# Altium footprint library ICs And Semiconductors THD.PcbLib: 507 footprints (part 30 of 32)
Each footprint in its own frame and in the unit in brackets; x right, y up, seen from the top. Pads: shape width x height; smd on the part's side, far side on the other; paste and mask are expansions set on the pad; w line width, h text height; cw(c..) or ccw(c..) is an arc to the next point about the centre after c.
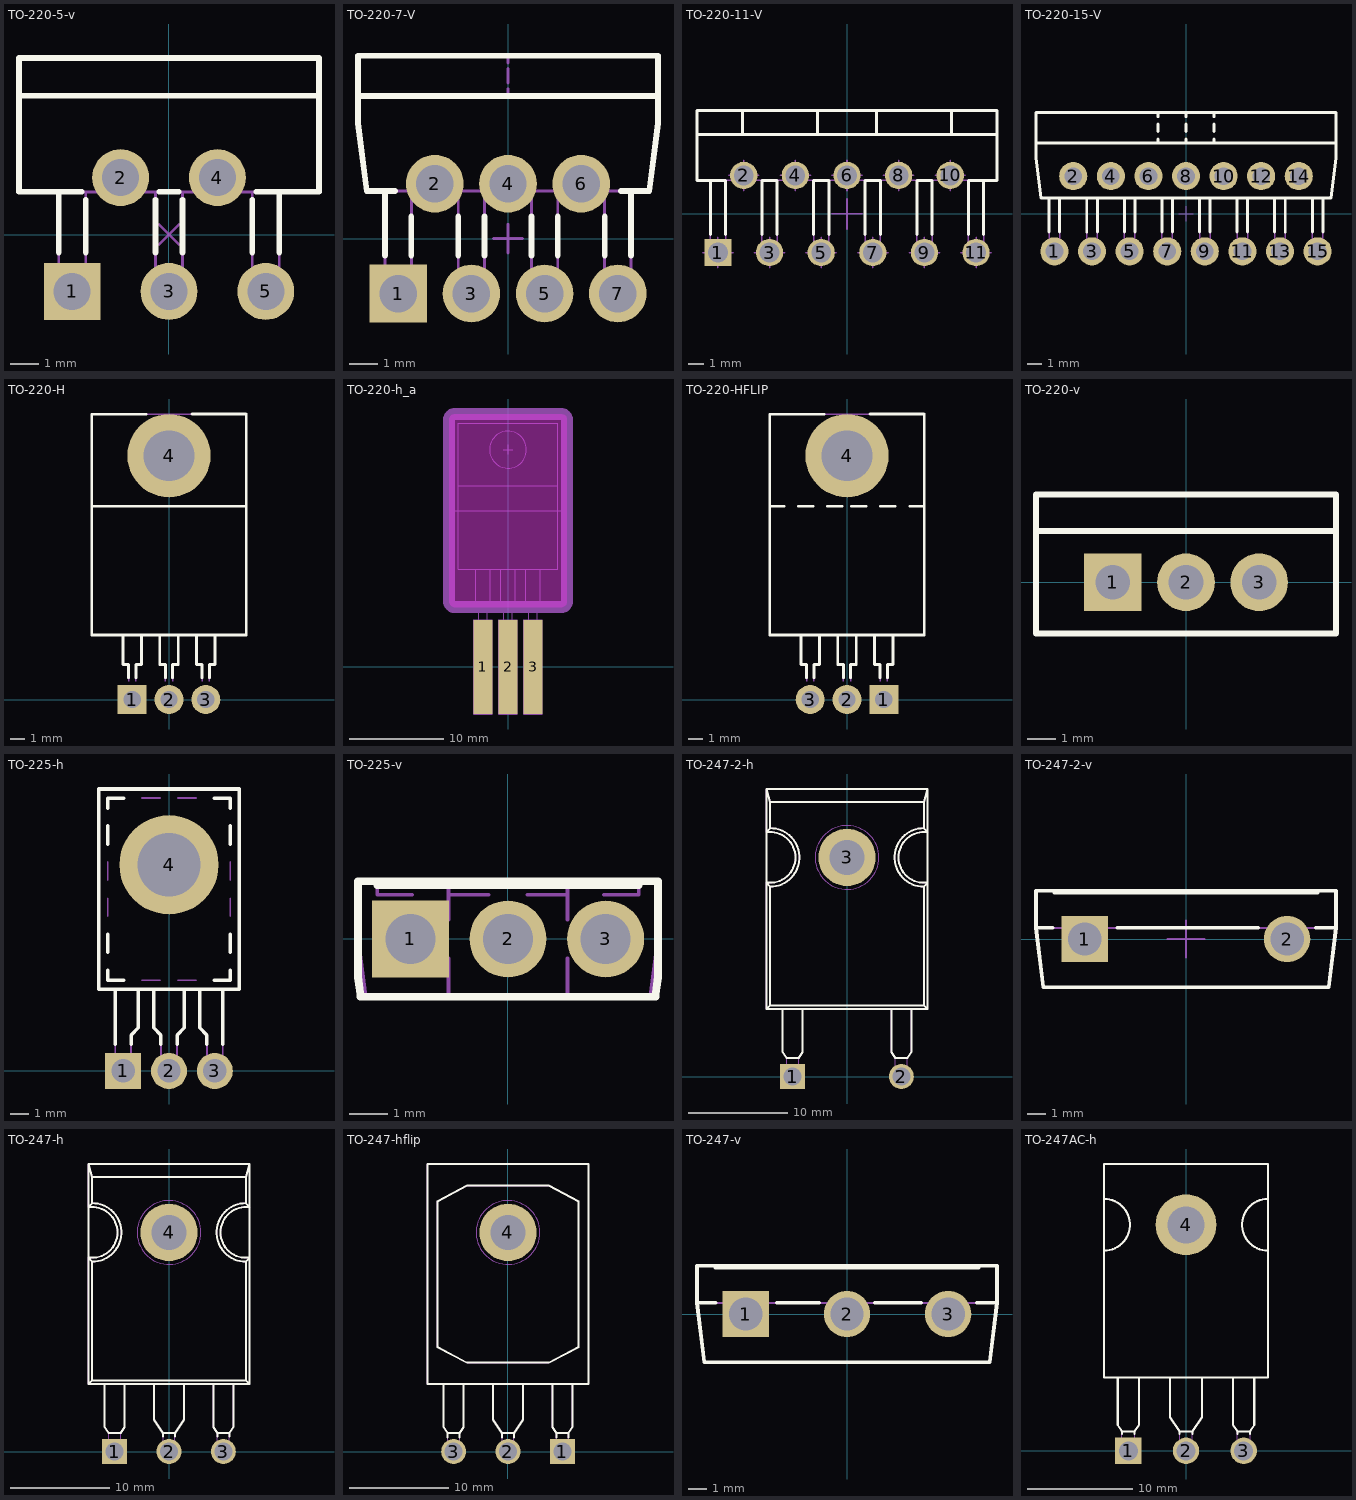
[diagram p29: the footprints below, top view; thin cyan lines are the x and y axes]

## TO-220-5-v [mm] "TO-220 5-Terminal - Vertical Mount"
height 15.57
pads (5):
  rect 2x2 hole 1.3: 1(-3.4,-2)
  round 2 hole 1.3: 2(-1.7,2) 3(0,-2) 4(1.7,2) 5(3.4,-2)
Top Overlay:
  lines w0.2: -5.27,4.88 5.27,4.88 ; -3.875,-0.63 -3.875,1.5 ; -3.061,1.5 -5.27,1.5 -5.27,6.2 5.27,6.2 5.27,1.5 3.061,1.5 ; -2.925,-0.63 -2.925,1.224 ; -0.475,-0.63 -0.475,1.224 ; -0.339,1.5 0.339,1.5 ; 0.475,-0.63 0.475,1.224 ; 2.925,-0.63 2.925,1.224 ; 3.875,-0.63 3.875,1.5
Notvisible:
  lines w0.1: -3.9,-2 -3.4,-2 ; -3.4,-2.5 -3.4,-2 ; -3.4,-1.5 -3.4,-2 ; -2.9,-2 -3.4,-2 ; -2.2,2 -1.7,2 ; -1.7,1.5 -1.7,2 ; -1.7,2.5 -1.7,2 ; -1.2,2 -1.7,2 ; -0.5,-2 0,-2 ; -0.353,-0.354 0,0 ; -0.353,0.354 0,0 ; 0,-2.5 0,-2 ; 0,-1.5 0,-2 ; 0.354,-0.354 0,0 ; 0.354,0.354 0,0 ; 0.5,-2 0,-2 ; 1.2,2 1.7,2 ; 1.7,1.5 1.7,2 ; 1.7,2.5 1.7,2 ; 2.2,2 1.7,2 ; 2.9,-2 3.4,-2 ; 3.4,-2.5 3.4,-2 ; 3.4,-1.5 3.4,-2 ; 3.9,-2 3.4,-2
Mechanical 14:
  lines w0.1: -5.27,4.88 5.27,4.88 ; -3.875,1.5 -3.875,-2.32 -2.925,-2.32 -2.925,1.5 ; -0.475,1.5 -0.475,-2.32 0.475,-2.32 0.475,1.5 ; 2.925,1.5 2.925,-2.32 3.875,-2.32 3.875,1.5 ; -5.27,1.5 5.27,1.5 5.27,6.2 -5.27,6.2 -5.27,1.5
3D body "TO-220-5-V.stp": height 21.79, standoff -3.8, extent -5.27,-2.32 5.27,6.2

## TO-220-7-V [mm] "TO-220 7 Leads - Vertical Mount"
height 21.37
pads (7):
  rect 2x2 hole 1.3: 1(-3.81,-1.905)
  round 2 hole 1.3: 2(-2.54,1.905) 3(-1.27,-1.905) 4(0,1.905) 5(1.27,-1.905) 6(2.54,1.905) 7(3.81,-1.905)
Top Overlay:
  lines w0.2: -5.205,4.95 5.205,4.95 ; -4.265,-0.581 -4.265,1.65 ; -3.917,1.65 -4.905,1.65 -5.205,4 -5.205,6.35 5.205,6.35 5.205,4 4.905,1.65 3.917,1.65 ; -3.355,-0.581 -3.355,0.767 ; -1.725,-0.581 -1.725,0.767 ; -0.815,-0.581 -0.815,0.767 ; 0.815,-0.581 0.815,0.767 ; 1.725,-0.581 1.725,0.767 ; 3.355,-0.581 3.355,0.767 ; 4.265,-0.581 4.265,1.65
Notvisible:
  lines w0.1: -4.31,-1.905 -3.81,-1.905 ; -3.81,-2.405 -3.81,-1.905 ; -3.81,-1.405 -3.81,-1.905 ; -3.31,-1.905 -3.81,-1.905 ; -3.04,1.905 -2.54,1.905 ; -2.54,1.405 -2.54,1.905 ; -2.54,2.405 -2.54,1.905 ; -2.04,1.905 -2.54,1.905 ; -1.77,-1.905 -1.27,-1.905 ; -1.27,-2.405 -1.27,-1.905 ; -1.27,-1.405 -1.27,-1.905 ; -0.77,-1.905 -1.27,-1.905 ; -0.5,0 0,0 ; -0.5,1.905 0,1.905 ; 0,-0.5 0,0 ; 0,0.5 0,0 ; 0,1.405 0,1.905 ; 0,2.405 0,1.905 ; 0,4.95 0,5.2 ; 0,5.4 0,5.65 0,5.9 ; 0,6.1 0,6.35 ; 0.5,0 0,0 ; 0.5,1.905 0,1.905 ; 0.77,-1.905 1.27,-1.905 ; 1.27,-2.405 1.27,-1.905 ; 1.27,-1.405 1.27,-1.905 ; 1.77,-1.905 1.27,-1.905 ; 2.04,1.905 2.54,1.905 ; 2.54,1.405 2.54,1.905 ; 2.54,2.405 2.54,1.905 ; 3.04,1.905 2.54,1.905 ; 3.31,-1.905 3.81,-1.905 ; 3.81,-2.405 3.81,-1.905 ; 3.81,-1.405 3.81,-1.905 ; 4.31,-1.905 3.81,-1.905
Mechanical 14:
  lines w0.1: -5.205,4.95 5.205,4.95 ; -4.265,1.65 -4.265,-2.23 -3.355,-2.23 -3.355,1.65 ; -2.995,1.65 -2.995,1.58 -2.085,1.58 -2.085,1.65 ; -1.725,1.65 -1.725,-2.23 -0.815,-2.23 -0.815,1.65 ; -0.455,1.65 -0.455,1.58 0.455,1.58 0.455,1.65 ; 0.815,1.65 0.815,-2.23 1.725,-2.23 1.725,1.65 ; 2.085,1.65 2.085,1.58 2.995,1.58 2.995,1.65 ; 3.355,1.65 3.355,-2.23 4.265,-2.23 4.265,1.65 ; -5.205,4 -5.205,6.35 5.205,6.35 5.205,4 4.905,1.65 -4.905,1.65 -5.205,4
3D body "TO-220-7-V.stp": height 21.74, standoff -3.8, extent -5.205,-2.23 5.205,6.35

## TO-220-11-V [mm] "TO-220 11 Leads - Vertical Mount"
height 20.82
pads (11):
  rect 1.8x1.8 hole 1.3: 1(-8.5,-2.54)
  round 1.8 hole 1.3: 2(-6.8,2.54) 3(-5.1,-2.54) 4(-3.4,2.54) 5(-1.7,-2.54) 6(0,2.54) 7(1.7,-2.54) 8(3.4,2.54) 9(5.1,-2.54) 10(6.8,2.54) 11(8.5,-2.54)
Top Overlay:
  lines w0.2: -9.88,5.23 9.88,5.23 ; -9,-1.34 -9,2.21 ; -8,-1.34 -8,2.21 -9.88,2.21 -9.88,6.83 9.88,6.83 9.88,2.21 8,2.21 8,-1.34 ; -6.88,5.23 -6.88,6.83 ; -5.6,-1.34 -5.6,2.21 -4.6,2.21 -4.6,-1.34 ; -2.2,-1.34 -2.2,2.21 -1.2,2.21 -1.2,-1.34 ; -1.93,5.23 -1.93,6.83 ; 1.2,-1.34 1.2,2.21 2.2,2.21 2.2,-1.34 ; 1.93,5.23 1.93,6.83 ; 4.6,-1.34 4.6,2.21 5.6,2.21 5.6,-1.34 ; 6.88,5.23 6.88,6.83 ; 9,-1.34 9,2.21
Notvisible:
  lines w0.1: -9.5,-2.54 -8.5,-2.54 ; -8.5,-3.54 -8.5,-2.54 ; -8.5,-1.54 -8.5,-2.54 ; -7.8,2.54 -6.8,2.54 ; -7.5,-2.54 -8.5,-2.54 ; -6.8,1.54 -6.8,2.54 ; -6.8,3.54 -6.8,2.54 ; -6.1,-2.54 -5.1,-2.54 ; -5.8,2.54 -6.8,2.54 ; -5.1,-3.54 -5.1,-2.54 ; -5.1,-1.54 -5.1,-2.54 ; -4.4,2.54 -3.4,2.54 ; -4.1,-2.54 -5.1,-2.54 ; -3.4,1.54 -3.4,2.54 ; -3.4,3.54 -3.4,2.54 ; -2.7,-2.54 -1.7,-2.54 ; -2.4,2.54 -3.4,2.54 ; -1.7,-3.54 -1.7,-2.54 ; -1.7,-1.54 -1.7,-2.54 ; -1,0 0,0 ; -1,2.54 0,2.54 ; -0.7,-2.54 -1.7,-2.54 ; 0,-1 0,0 ; 0,1 0,0 ; 0,1.54 0,2.54 ; 0,3.54 0,2.54 ; 0.7,-2.54 1.7,-2.54 ; 1,0 0,0 ; 1,2.54 0,2.54 ; 1.7,-3.54 1.7,-2.54 ; 1.7,-1.54 1.7,-2.54 ; 2.4,2.54 3.4,2.54 ; 2.7,-2.54 1.7,-2.54 ; 3.4,1.54 3.4,2.54 ; 3.4,3.54 3.4,2.54 ; 4.1,-2.54 5.1,-2.54 ; 4.4,2.54 3.4,2.54 ; 5.1,-3.54 5.1,-2.54 ; 5.1,-1.54 5.1,-2.54 ; 5.8,2.54 6.8,2.54 ; 6.1,-2.54 5.1,-2.54 ; 6.8,1.54 6.8,2.54 ; 6.8,3.54 6.8,2.54 ; 7.5,-2.54 8.5,-2.54 ; 7.8,2.54 6.8,2.54 ; 8.5,-3.54 8.5,-2.54 ; 8.5,-1.54 8.5,-2.54 ; 9.5,-2.54 8.5,-2.54
Mechanical 14:
  lines w0.1: -9.88,5.23 9.88,5.23 ; -9,2.21 -9,-2.84 -8,-2.84 -8,2.21 ; -6.88,5.23 -6.88,6.83 ; -5.6,2.21 -5.6,-2.84 -4.6,-2.84 -4.6,2.21 ; -2.2,2.21 -2.2,-2.84 -1.2,-2.84 -1.2,2.21 ; -1.93,5.23 -1.93,6.83 ; 1.2,2.21 1.2,-2.84 2.2,-2.84 2.2,2.21 ; 1.93,5.23 1.93,6.83 ; 4.6,2.21 4.6,-2.84 5.6,-2.84 5.6,2.21 ; 6.88,5.23 6.88,6.83 ; 8,2.21 8,-2.84 9,-2.84 9,2.21 ; -9.88,2.21 -9.88,6.83 9.88,6.83 9.88,2.21 -9.88,2.21
3D body "TO-220-11-V.stp": height 21.09, standoff -3.8, extent -9.88,-2.84 9.88,6.83

## TO-220-15-V [mm] "TO-220, 15 Leads, Vertical Mount"
height 20.8
pads (15):
  round 1.9 hole 1.2: 1(-8.89,-2.54) 2(-7.62,2.54) 3(-6.35,-2.54) 4(-5.08,2.54) 5(-3.81,-2.54) 6(-2.54,2.54) 7(-1.27,-2.54) 8(0,2.54) 9(1.27,-2.54) 10(2.54,2.54) 11(3.81,-2.54) 12(5.08,2.54) 13(6.35,-2.54) 14(7.62,2.54) 15(8.89,-2.54)
Top Overlay:
  lines w0.2: -10.135,4.775 10.135,4.775 ; -9.246,-1.238 -9.246,1.067 ; -8.534,-1.238 -8.534,1.067 ; -6.706,-1.238 -6.706,1.067 ; -5.994,-1.238 -5.994,1.067 ; -4.166,-1.238 -4.166,1.067 ; -3.454,-1.238 -3.454,1.067 ; -1.905,4.775 -1.905,5.054 ; -1.905,5.554 -1.905,6.054 ; -1.905,6.554 -1.905,6.833 ; -1.626,-1.238 -1.626,1.067 ; -0.914,-1.238 -0.914,1.067 ; 0,4.775 0,5.054 ; 0,5.554 0,6.054 ; 0,6.554 0,6.833 ; 0.914,-1.238 0.914,1.067 ; 1.626,-1.238 1.626,1.067 ; 1.905,4.775 1.905,5.054 ; 1.905,5.554 1.905,6.054 ; 1.905,6.554 1.905,6.833 ; 3.454,-1.238 3.454,1.067 ; 4.166,-1.238 4.166,1.067 ; 5.994,-1.238 5.994,1.067 ; 6.706,-1.238 6.706,1.067 ; 8.534,-1.238 8.534,1.067 ; 9.246,-1.238 9.246,1.067 ; -10.135,3.747 -9.806,1.067 9.806,1.067 10.135,3.747 10.135,6.833 -10.135,6.833 -10.135,3.747
Notvisible:
  lines w0.05: -9.39,-2.54 -8.89,-2.54 -8.89,-3.04 ; -8.12,2.54 -7.62,2.54 -7.62,2.04 ; -6.85,-2.54 -6.35,-2.54 -6.35,-3.04 ; -5.58,2.54 -5.08,2.54 -5.08,2.04 ; -4.31,-2.54 -3.81,-2.54 -3.81,-3.04 ; -3.04,2.54 -2.54,2.54 -2.54,2.04 ; -1.77,-2.54 -1.27,-2.54 -1.27,-3.04 ; -0.5,0 0,0 ; -0.5,2.54 0,2.54 0,2.04 ; 0,-0.5 0,0 ; 0,0.5 0,0 ; 0.5,0 0,0 ; 0.77,-2.54 1.27,-2.54 1.27,-3.04 ; 2.04,2.54 2.54,2.54 2.54,2.04 ; 3.31,-2.54 3.81,-2.54 3.81,-3.04 ; 4.58,2.54 5.08,2.54 5.08,2.04 ; 5.85,-2.54 6.35,-2.54 6.35,-3.04 ; 7.12,2.54 7.62,2.54 7.62,2.04 ; 8.39,-2.54 8.89,-2.54 8.89,-3.04
Mechanical 14:
  lines w0.1: -10.135,4.775 10.135,4.775 ; -9.246,1.067 -9.246,-2.743 -8.534,-2.743 -8.534,1.067 ; -6.706,1.067 -6.706,-2.743 -5.994,-2.743 -5.994,1.067 ; -4.166,1.067 -4.166,-2.743 -3.454,-2.743 -3.454,1.067 ; -1.905,4.775 -1.905,5.054 ; -1.905,5.554 -1.905,6.054 ; -1.905,6.554 -1.905,6.833 ; -1.626,1.067 -1.626,-2.743 -0.914,-2.743 -0.914,1.067 ; 0,4.775 0,5.054 ; 0,5.554 0,6.054 ; 0,6.554 0,6.833 ; 0.914,1.067 0.914,-2.743 1.626,-2.743 1.626,1.067 ; 1.905,4.775 1.905,5.054 ; 1.905,5.554 1.905,6.054 ; 1.905,6.554 1.905,6.833 ; 3.454,1.067 3.454,-2.743 4.166,-2.743 4.166,1.067 ; 5.994,1.067 5.994,-2.743 6.706,-2.743 6.706,1.067 ; 8.534,1.067 8.534,-2.743 9.246,-2.743 9.246,1.067 ; -10.135,3.747 -9.806,1.067 9.806,1.067 10.135,3.747 10.135,6.833 -10.135,6.833 -10.135,3.747
3D body "TO-220-15-V.stp": height 20.83, standoff -3.98, extent -10.134,-2.743 10.135,6.833

## TO-220-H [mm] "TO-220 3-Terminal + Tab - Horizontal Mount"
height 4.7
pads (4):
  rect 2x2 hole 1.2: 1(-2.54,0)
  round 2 hole 1.2: 2(0,0) 3(2.54,0)
  round 5.75 hole 3.5: 4(0,16.828)
Top Overlay:
  lines w0.2: -5.334,13.335 5.334,13.335 ; -3.175,4.445 -3.175,2.413 -2.794,2.413 -2.794,1.5 ; -2.286,1.5 -2.286,2.413 -1.905,2.413 -1.905,4.445 ; -1.6,19.685 -5.334,19.685 -5.334,4.445 5.334,4.445 5.334,19.685 5.319,19.7 1.6,19.7 ; -0.635,4.445 -0.635,2.413 -0.254,2.413 -0.254,1.5 ; 0.254,1.5 0.254,2.413 0.635,2.413 0.635,4.445 ; 1.905,4.445 1.905,2.413 2.286,2.413 2.286,1.5 ; 2.794,1.5 2.794,2.413 3.175,2.413 3.175,4.445
Mechanical 14:
  circle w0.1: c0,16.828 r2
  lines w0.1: -5.334,13.335 5.334,13.335 ; -3.175,4.445 -3.175,2.413 -2.794,2.413 -2.794,1.27 ; -2.286,1.27 -2.286,2.413 -1.905,2.413 -1.905,4.445 ; -0.635,4.445 -0.635,2.413 -0.254,2.413 -0.254,1.27 ; 0.254,1.27 0.254,2.413 0.635,2.413 0.635,4.445 ; 1.905,4.445 1.905,2.413 2.286,2.413 2.286,1.27 ; 2.794,1.27 2.794,2.413 3.175,2.413 3.175,4.445 ; -5.334,4.445 -5.334,19.685 5.334,19.685 5.334,4.445 -5.334,4.445
3D body "TO-220-H.stp": height 4.7, standoff -3.5, extent -5.27,-0.28 5.27,19.49

## TO-220-h_a [mm] "TO-220 3-Terminal - Horizontal Surface Mount Through The Circuit Board"
height 4.82
pads (3):
  rect 2x10 smd paste-1: 1(-2.66,0) 2(0,0) 3(2.658,0)
Keep-Out Layer:
  board cut-out: -6.25,6.95 -6.25,26.25 -6.25,26.369 -6.159,26.59 -5.99,26.759 -5.769,26.85 -5.65,26.85 5.65,26.85 5.769,26.85 5.99,26.759 6.159,26.59 6.25,26.369 6.25,26.25 6.25,6.95 6.25,6.831 6.159,6.61 5.99,6.441 5.769,6.35 5.65,6.35 -5.65,6.35 -5.769,6.35 -5.99,6.441 -6.159,6.61 -6.25,6.831
Mechanical 1:
  lines w1.27: -6.25,6.95 ccw(c-5.65,6.95) -5.65,6.35 5.65,6.35 ccw(c5.65,6.95) 6.25,6.95 6.25,26.25 ccw(c5.65,26.25) 5.65,26.85 -5.65,26.85 ccw(c-5.65,26.25) -6.25,26.25 -6.25,6.95
Notvisible:
  lines w0.1: -3.16,0 -2.66,0 ; -2.66,-0.5 -2.66,0 ; -2.66,0.5 -2.66,0 ; -2.16,0 -2.66,0 ; -0.5,0 0,0 ; -0.5,23.06 0,23.06 ; 0,-0.5 0,0 ; 0,0.5 0,0 ; 0,22.56 0,23.06 ; 0,23.56 0,23.06 ; 0.5,0 0,0 ; 0.5,23.06 0,23.06 ; 2.158,0 2.658,0 ; 2.658,-0.5 2.658,0 ; 2.658,0.5 2.658,0 ; 3.158,0 2.658,0 ; -6.25,6.95 ccw(c-5.65,6.95) -5.65,6.35 5.65,6.35 ccw(c5.65,6.95) 6.25,6.95 6.25,26.25 ccw(c5.65,26.25) 5.65,26.85 -5.65,26.85 ccw(c-5.65,26.25) -6.25,26.25 -6.25,6.95 ; -3.66,-5 -1.66,-5 -1.66,5 -3.66,5 -3.66,-5 ; -1,-5 1,-5 1,5 -1,5 -1,-5 ; 1.657,-5 3.658,-5 3.658,5 1.657,5 1.657,-5
Mechanical 14:
  circle w0.1: c0,23.06 r1.961
  lines w0.1: -6.25,16.6 6.25,16.6 ; -5.27,19.25 5.27,19.25 ; -3.42,10.36 -3.42,6.56 -3.115,6.26 -3.115,-3.91 -2.205,-3.91 -2.205,6.26 -1.9,6.56 -1.9,10.36 ; -0.76,10.36 -0.76,6.56 -0.455,6.26 -0.455,-3.91 0.455,-3.91 0.455,6.26 0.76,6.56 0.76,10.36 ; 1.9,10.36 1.9,6.56 2.2,6.26 2.2,-3.91 3.115,-3.91 3.115,6.26 3.42,6.56 3.42,10.36 ; -5.27,10.36 -5.27,25.85 5.27,25.85 5.27,10.36 -5.27,10.36
Drill Drawing:
  lines w0.1: -6.25,11.2 -6.25,12.1 ; -5.65,11.382 -6.25,11.6 ; -5.65,11.818 -6.25,11.6 ; -4.218,6.95 -4,6.35 ; -4.218,26.25 -4,26.85 ; -3.782,6.95 -4,6.35 ; -3.782,26.25 -4,26.85 ; -0.5,16.6 0,16.6 ; 0,16.1 0,16.6 ; 0,17.1 0,16.6 ; 0.5,16.6 0,16.6 ; 1.77,7.277 5.323,7.277 6.074,6.526 ; 5.168,6.948 6.074,6.526 ; 5.65,11.382 6.25,11.6 ; 5.65,11.818 6.25,11.6 ; 5.652,7.432 6.074,6.526 ; -6.25,11.6 6.25,11.6 ; -4,6.35 -4,26.85 ; -6.25,6.95 ccw(c-5.65,6.95) -5.65,6.35 5.65,6.35 ccw(c5.65,6.95) 6.25,6.95 6.25,26.25 ccw(c5.65,26.25) 5.65,26.85 -5.65,26.85 ccw(c-5.65,26.25) -6.25,26.25 -6.25,6.95 ; 6.25,11.2 6.25,12.1 6.25,11.2
  text "r0.6" at 1.863,7.392 h1
  text "12.5mm" at 0.842,11.835 h1
  text "20.5mm" at -4.279,14.435 h1
3D body "TO-220-H_a.stp": height 2.09, standoff -2.61, extent -5.27,-3.91 5.27,25.85

## TO-220-HFLIP [mm] "TO-220 3-Terminal + Tab - Flipped Horizontal Mount"
height 4.7
pads (4):
  rect 2x2 hole 1.2: 1(2.54,0)
  round 2 hole 1.2: 2(0,0) 3(-2.54,0)
  round 5.75 hole 3.5: 4(0,16.828)
Top Overlay:
  lines w0.2: -5.334,13.335 -4.334,13.335 ; -3.334,13.335 -2.334,13.335 ; -3.175,4.445 -3.175,2.413 -2.794,2.413 -2.794,1.5 ; -2.286,1.5 -2.286,2.413 -1.905,2.413 -1.905,4.445 ; -1.6,19.685 -5.334,19.685 -5.334,4.445 5.334,4.445 5.334,19.685 5.319,19.7 1.6,19.7 ; -1.334,13.335 -0.334,13.335 ; -0.635,4.445 -0.635,2.413 -0.254,2.413 -0.254,1.5 ; 0.254,1.5 0.254,2.413 0.635,2.413 0.635,4.445 ; 0.3,13.335 1.3,13.335 ; 1.905,4.445 1.905,2.413 2.286,2.413 2.286,1.5 ; 2.3,13.335 3.3,13.335 ; 2.794,1.5 2.794,2.413 3.175,2.413 3.175,4.445 ; 4.334,13.335 5.334,13.335
Mechanical 14:
  circle w0.1: c0,16.828 r2
  lines w0.1: -5.334,13.335 -4.334,13.335 ; -3.334,13.335 -2.334,13.335 ; -3.175,4.445 -3.175,2.413 -2.794,2.413 -2.794,1.27 ; -2.286,1.27 -2.286,2.413 -1.905,2.413 -1.905,4.445 ; -1.334,13.335 -0.334,13.335 ; -0.635,4.445 -0.635,2.413 -0.254,2.413 -0.254,1.27 ; 0.254,1.27 0.254,2.413 0.635,2.413 0.635,4.445 ; 0.3,13.335 1.3,13.335 ; 1.905,4.445 1.905,2.413 2.286,2.413 2.286,1.27 ; 2.3,13.335 3.3,13.335 ; 2.794,1.27 2.794,2.413 3.175,2.413 3.175,4.445 ; 4.334,13.335 5.334,13.335 ; -5.334,4.445 5.334,4.445 5.334,19.685 -5.334,19.685 -5.334,4.445
3D body "TO-220-HFLIP.stp": height 4.7, standoff -4.7, extent -5.27,-0.28 5.27,19.49

## TO-220-v [mm] "TO-220 3-Terminal - Vertical Mount"
height 22.86
pads (3):
  rect 2x2 hole 1.2: 1(-2.54,0)
  round 2 hole 1.2: 2(0,0) 3(2.54,0)
Top Overlay:
  lines w0.2: -5.207,1.778 5.207,1.778 ; -5.207,-1.778 -5.207,3.048 5.207,3.048 5.207,-1.778 -5.207,-1.778
Mechanical 14:
  lines w0.1: -5.207,1.778 5.207,1.778 ; -5.207,-1.778 -5.207,3.048 5.207,3.048 5.207,-1.778 -5.207,-1.778
3D body "TO-220-V.stp": height 20.5, standoff -3.5, extent -5.27,-1.75 5.27,2.95

## TO-225-h [mm] "TO-225, 3-Terminal, Horizontal Mount"
height 3
pads (4):
  rect 2x2 hole 1.3: 1(-2.54,0)
  round 2 hole 1.3: 2(0,0) 3(2.54,0)
  round 5.5 hole 3.5: 4(0,11.43)
Top Overlay:
  lines w0.2: -3.4,5.578 -3.4,5.03 -2.5,5.03 ; -3.4,6.578 -3.4,7.578 ; -3.4,12.578 -3.4,13.578 ; -3.4,14.578 -3.4,15.125 -2.5,15.125 ; -2.98,1.486 -2.98,4.53 ; -2.1,1.486 -2.1,1.99 -1.7,2.39 -1.7,4.53 ; -0.85,4.53 -0.85,2.39 -0.45,1.99 -0.45,1.483 ; 0.45,1.483 0.45,1.99 0.85,2.39 0.85,4.53 ; 1.7,4.53 1.7,2.39 2.1,1.99 2.1,1.486 ; 2.5,5.03 3.4,5.03 3.4,5.578 ; 2.5,15.125 3.4,15.125 3.4,14.578 ; 2.98,1.486 2.98,4.53 ; 3.4,6.578 3.4,7.578 ; 3.4,12.578 3.4,13.578 ; -3.9,4.53 3.9,4.53 3.9,15.63 -3.9,15.63 -3.9,4.53
Notvisible:
  lines w0.05: -3.04,0 -2.54,0 ; -2.54,-0.5 -2.54,0 ; -2.54,0.5 -2.54,0 ; -2.04,0 -2.54,0 ; -0.5,0 0,0 ; 0,-0.5 0,0 ; 0,0.5 0,0 ; 0.5,0 0,0 ; 2.04,0 2.54,0 ; 2.54,-0.5 2.54,0 ; 2.54,0.5 2.54,0 ; 3.04,0 2.54,0
Mechanical 14:
  circle w0.1: c0,11.43 r1.55
  lines w0.1: -3.4,5.578 -3.4,5.03 -2.5,5.03 ; -3.4,6.578 -3.4,7.578 ; -3.4,8.578 -3.4,9.578 ; -3.4,10.578 -3.4,11.578 ; -3.4,12.578 -3.4,13.578 ; -3.4,14.578 -3.4,15.125 -2.5,15.125 ; -2.98,4.53 -2.98,-0.315 -2.1,-0.315 -2.1,1.99 -1.7,2.39 -1.7,4.53 ; -1.521,11.731 -1.809,11.897 cw(c-1.559,12.33) -1.309,12.763 -1.021,12.597 ; -1.5,5.03 -0.5,5.03 ; -1.5,15.125 -0.5,15.125 ; -0.85,4.53 -0.85,2.39 -0.45,1.99 -0.45,-0.315 0.45,-0.315 0.45,1.99 0.85,2.39 0.85,4.53 ; 0.5,5.03 1.5,5.03 ; 0.5,15.125 1.5,15.125 ; 1.021,12.597 1.309,12.763 cw(c1.559,12.33) 1.809,11.897 1.521,11.731 ; 1.7,4.53 1.7,2.39 2.1,1.99 2.1,-0.315 2.98,-0.315 2.98,4.53 ; 2.5,5.03 3.4,5.03 3.4,5.578 ; 2.5,15.125 3.4,15.125 3.4,14.578 ; 3.4,6.578 3.4,7.578 ; 3.4,8.578 3.4,9.578 ; 3.4,10.578 3.4,11.578 ; 3.4,12.578 3.4,13.578 ; -3.9,4.53 3.9,4.53 3.9,15.63 -3.9,15.63 -3.9,4.53
3D body "TO-225-H.stp": height 3, standoff -3.5, extent -3.9,-0.315 3.9,15.63

## TO-225-v [mm] "TO-225, 3-Terminal, Vertical Mount"
height 13.64
pads (3):
  rect 2x2 hole 1.3: 1(-2.54,0)
  round 2 hole 1.3: 2(0,0) 3(2.54,0)
Top Overlay:
  lines w0.2: -3.4,1.499 -3.4,1.4 3.4,1.4 3.4,1.499 ; -3.9,-0.999 -3.833,-1.501 3.833,-1.501 3.9,-0.998 3.9,1.499 -3.9,1.499 -3.9,-0.999
Notvisible:
  lines w0.05: -3.04,0 -2.54,0 ; -2.54,-0.5 -2.54,0 ; -2.54,0.5 -2.54,0 ; -2.04,0 -2.54,0 ; -0.5,0 0,0 ; 0,-0.5 0,0 ; 0,0.5 0,0 ; 0.5,0 0,0 ; 2.04,0 2.54,0 ; 2.54,-0.5 2.54,0 ; 2.54,0.5 2.54,0 ; 3.04,0 2.54,0
Mechanical 14:
  lines w0.1: -3.4,1.499 -3.4,1.149 -2.5,1.149 ; -1.55,-1.501 -1.55,-0.501 ; -1.55,0.499 -1.55,1.499 ; -1.5,1.149 -0.5,1.149 ; 0.5,1.149 1.5,1.149 ; 1.55,-1.501 1.55,-0.501 ; 1.55,0.499 1.55,1.499 ; 2.5,1.149 3.4,1.149 3.4,1.499 ; -3.9,-0.001 -3.9,1.499 3.9,1.499 3.9,-0.001 3.7,-1.501 -3.7,-1.501 -3.9,-0.001
3D body "TO-225-V.stp": height 13.64, standoff -3.5, extent -3.9,-1.5 3.9,1.5

## TO-247-2-h [mm] "TO-247 2-Terminal - Horizontal Mount"
height 5.26
pads (3):
  rect 2.5x2.5 hole 1.8: 1(-5.46,0)
  round 2.5 hole 1.8: 2(5.46,0)
  round 5.75 hole 3.5: 3(0,22)
Top Overlay:
  lines w0.2: -6.46,6.76 -6.46,2.44 -6.06,1.84 -4.86,1.84 -4.46,2.44 -4.46,6.76 ; 4.46,6.76 4.46,2.44 4.86,1.84 6.06,1.84 6.46,2.44 6.46,6.76 ; 8.1,19.45 7.71,19.06 ; 8.1,19.49 cw(c7.71,22) 8.1,24.51 7.71,24.94 ; 8.1,28.86 7.71,27.567 ; -8.1,6.76 -8.1,28.86 ; -8.1,6.76 -7.71,7.153 ; -8.1,6.76 8.1,6.76 ; -8.1,28.86 -7.71,27.567 ; -8.1,28.86 8.103,28.869 8.1,6.76 ; -7.71,7.153 -7.71,19.06 ; -7.71,7.153 7.71,7.153 ; -7.71,19.06 ccw(c-7.71,22) -7.71,24.94 ; -7.71,19.06 -8.1,19.49 ccw(c-7.71,22) -8.1,24.51 -7.71,24.94 ; -7.71,24.94 -7.71,27.567 ; -7.71,27.567 7.71,27.567 ; 7.71,7.153 8.1,6.76 ; 7.71,7.153 7.71,19.06 ; 7.71,19.06 cw(c7.71,22) 7.71,24.94 ; 7.71,24.94 7.71,27.567
Notvisible:
  lines w0.1: -6.46,0 -5.46,0 ; -5.46,-1 -5.46,0 ; -5.46,1 -5.46,0 ; -4.46,0 -5.46,0 ; -1,22 0,22 ; 0,21 0,22 ; 0,23 0,22 ; 1,22 0,22 ; 4.46,0 5.46,0 ; 5.46,-1 5.46,0 ; 5.46,1 5.46,0 ; 6.46,0 5.46,0
Mechanical 14:
  circle w0.1: c0,22 r3.202
  lines w0.1: -6.46,6.76 -6.46,2.44 -6.06,1.84 ; -4.46,6.76 -4.46,2.44 -4.86,1.84 ; 4.46,6.76 4.46,2.44 4.86,1.84 ; 6.46,6.76 6.46,2.44 6.06,1.84 ; 8.103,28.869 -8.1,28.86 ; -8.1,6.76 -7.71,7.153 ; -8.1,6.76 -8.1,19.49 ; -8.1,6.76 8.1,6.76 ; -8.1,19.49 ccw(c-7.71,22) -8.1,24.51 ; -8.1,19.49 -7.71,19.06 ; -8.1,24.51 -7.71,24.94 ; -8.1,24.51 -8.1,28.86 ; -8.1,28.86 -7.71,27.567 ; -7.71,7.153 -7.71,19.06 ; -7.71,7.153 7.71,7.153 ; -7.71,19.06 ccw(c-7.71,22) -7.71,24.94 ; -7.71,24.94 -7.71,27.567 ; -7.71,27.567 7.71,27.567 ; -6.06,1.84 -6.06,-0.5 -4.86,-0.5 -4.86,1.84 ; -6.06,1.84 -4.86,1.84 ; 4.86,1.84 4.86,-0.5 6.06,-0.5 6.06,1.84 ; 4.86,1.84 6.06,1.84 ; 7.71,7.153 8.1,6.76 ; 7.71,7.153 7.71,19.06 ; 7.71,19.06 cw(c7.71,22) 7.71,24.94 ; 7.71,19.06 8.1,19.49 ; 7.71,24.94 8.1,24.51 ; 7.71,24.94 7.71,27.567 ; 7.71,27.567 8.1,28.86 8.1,24.51 ; 8.1,6.76 8.1,19.49 ; 8.1,19.49 cw(c7.71,22) 8.1,24.51
3D body "TO-247-2-H.stp": height 5.2, standoff -3.8, extent -8.1,-0.5 8.1,28.86

## TO-247-2-v [mm] "TO-247 2-Terminal - Vertical Mount"
height 25
pads (2):
  rect 2.5x2.5 hole 1.8: 1(-5.46,0)
  round 2.5 hole 1.8: 2(5.46,0)
Top Overlay:
  lines w0.2: -7.2,0.6 -8.1,0.6 ; -7.1,2.6 -7.1,2.5 7.1,2.5 7.1,2.6 ; -3.7,0.6 3.9,0.6 ; 7,0.6 8.1,0.6 ; -8.1,0.6 -8.1,2.6 8.1,2.6 8.1,0.6 ; -8.1,0.6 -7.71,-2.6 7.71,-2.6 8.1,0.6
Notvisible:
  lines w0.1: -6.46,0 -5.46,0 ; -5.46,-1 -5.46,0 ; -5.46,1 -5.46,0 ; -4.46,0 -5.46,0 ; -1,0 0,0 ; 0,-1 0,0 ; 0,1 0,0 ; 1,0 0,0 ; 4.46,0 5.46,0 ; 5.46,-1 5.46,0 ; 5.46,1 5.46,0 ; 6.46,0 5.46,0
Mechanical 14:
  lines w0.1: -7.1,2.6 -7.1,2.5 7.1,2.5 7.1,2.6 ; -8.1,0.6 -8.1,2.6 8.1,2.6 8.1,0.6 ; -8.1,0.6 -7.71,-2.6 7.71,-2.6 8.1,0.6 ; -8.1,0.6 8.1,0.6
3D body "TO-247-2-V.stp": height 27.02, standoff -3.6, extent -8.1,-2.6 8.1,2.6

## TO-247-h [mm] "TO-247 3-Terminal - Horizontal Mount"
height 5.26
pads (4):
  rect 2.5x2.5 hole 1.8: 1(-5.46,0)
  round 2.5 hole 1.8: 2(0,0) 3(5.46,0)
  round 5.75 hole 3.5: 4(0,22)
Top Overlay:
  lines w0.2: -6.46,6.76 -6.46,2.44 -6.06,1.84 -4.86,1.84 -4.46,2.44 -4.46,6.76 ; -1.5,6.76 -1.5,3.19 -0.6,1.84 ; -0.6,1.5 -0.6,1.84 ; 0.6,1.5 0.6,1.84 ; 1.5,6.76 1.5,3.19 0.6,1.84 ; 4.46,6.76 4.46,2.44 4.86,1.84 ; 4.86,1.5 4.86,1.84 ; 6.06,1.5 6.06,1.84 ; 6.46,6.76 6.46,2.44 6.06,1.84 ; 8.1,19.45 7.71,19.06 ; 8.1,19.49 cw(c7.71,22) 8.1,24.51 7.71,24.94 ; 8.1,28.86 7.71,27.567 ; -8.1,6.76 8.1,6.76 ; -8.1,6.76 -7.71,7.153 ; -8.1,6.76 -8.1,28.86 ; -8.1,28.86 8.103,28.869 8.1,6.76 ; -8.1,28.86 -7.71,27.567 ; -7.71,7.153 7.71,7.153 ; -7.71,7.153 -7.71,19.06 ; -7.71,19.06 ccw(c-7.71,22) -7.71,24.94 ; -7.71,19.06 -8.1,19.49 ccw(c-7.71,22) -8.1,24.51 -7.71,24.94 ; -7.71,24.94 -7.71,27.567 ; -7.71,27.567 7.71,27.567 ; -0.6,1.84 0.6,1.84 ; 4.86,1.84 6.06,1.84 ; 7.71,7.153 7.71,19.06 ; 7.71,7.153 8.1,6.76 ; 7.71,19.06 cw(c7.71,22) 7.71,24.94 ; 7.71,24.94 7.71,27.567
Notvisible:
  lines w0.1: -6.46,0 -5.46,0 ; -5.46,-1 -5.46,0 ; -5.46,1 -5.46,0 ; -4.46,0 -5.46,0 ; -1,0 0,0 ; -1,22 0,22 ; 0,-1 0,0 ; 0,1 0,0 ; 0,21 0,22 ; 0,23 0,22 ; 1,0 0,0 ; 1,22 0,22 ; 4.46,0 5.46,0 ; 5.46,-1 5.46,0 ; 5.46,1 5.46,0 ; 6.46,0 5.46,0
Mechanical 14:
  circle w0.1: c0,22 r3.202
  lines w0.1: -6.46,6.76 -6.46,2.44 -6.06,1.84 ; -4.46,6.76 -4.46,2.44 -4.86,1.84 ; -1.5,6.76 -1.5,3.19 -0.6,1.84 ; 1.5,6.76 1.5,3.19 0.6,1.84 ; 4.46,6.76 4.46,2.44 4.86,1.84 ; 6.46,6.76 6.46,2.44 6.06,1.84 ; 8.103,28.869 -8.1,28.86 ; -8.1,6.76 8.1,6.76 ; -8.1,6.76 -8.1,19.49 ; -8.1,6.76 -7.71,7.153 ; -8.1,19.49 ccw(c-7.71,22) -8.1,24.51 ; -8.1,19.49 -7.71,19.06 ; -8.1,24.51 -8.1,28.86 ; -8.1,24.51 -7.71,24.94 ; -8.1,28.86 -7.71,27.567 ; -7.71,7.153 7.71,7.153 ; -7.71,7.153 -7.71,19.06 ; -7.71,19.06 ccw(c-7.71,22) -7.71,24.94 ; -7.71,24.94 -7.71,27.567 ; -7.71,27.567 7.71,27.567 ; -6.06,1.84 -4.86,1.84 ; -6.06,1.84 -6.06,-0.5 -4.86,-0.5 -4.86,1.84 ; -0.6,1.84 0.6,1.84 ; -0.6,1.84 -0.6,-0.5 0.6,-0.5 0.6,1.84 ; 4.86,1.84 6.06,1.84 ; 4.86,1.84 4.86,-0.5 6.06,-0.5 6.06,1.84 ; 7.71,7.153 7.71,19.06 ; 7.71,7.153 8.1,6.76 ; 7.71,19.06 cw(c7.71,22) 7.71,24.94 ; 7.71,19.06 8.1,19.49 ; 7.71,24.94 7.71,27.567 ; 7.71,24.94 8.1,24.51 ; 7.71,27.567 8.1,28.86 8.1,24.51 ; 8.1,6.76 8.1,19.49 ; 8.1,19.49 cw(c7.71,22) 8.1,24.51
3D body "TO-247-H.stp": height 5.2, standoff -3.8, extent -8.1,-0.5 8.1,28.86

## TO-247-hflip [mm] "TO-247 3-Terminal - Flipped Horizontal Mount"
height 5.26
pads (4):
  rect 2.5x2.5 hole 1.8: 1(5.46,0)
  round 2.5 hole 1.8: 2(0,0) 3(-5.46,0)
  round 5.75 hole 3.5: 4(0,22)
Top Overlay:
  lines w0.2: -6.46,6.76 -6.46,2.44 -6.06,1.84 ; -6.06,1.429 -6.06,1.84 ; -4.86,1.429 -4.86,1.84 ; -4.46,6.76 -4.46,2.44 -4.86,1.84 ; -1.5,6.76 -1.5,3.19 -0.6,1.84 ; -0.6,1.429 -0.6,1.84 ; 0.6,1.429 0.6,1.84 ; 1.5,6.76 1.5,3.19 0.6,1.84 ; 4.46,6.76 4.46,2.44 4.86,1.84 ; 4.86,1.429 4.86,1.84 ; 6.06,1.429 6.06,1.84 ; 6.46,6.76 6.46,2.44 6.06,1.84 ; 8.1,28.869 8.1,6.76 -8.1,6.76 -8.1,28.86 8.103,28.869 ; -6.06,1.84 -4.86,1.84 ; -0.6,1.84 0.6,1.84 ; 4.86,1.84 6.06,1.84 ; -7.1,10.51 -7.1,25.11 -4.1,26.7 4.1,26.7 7.1,25.11 7.1,10.51 4.1,8.92 -4.1,8.92 -7.1,10.51
Notvisible:
  lines w0.1: -5.46,0 -5.46,1 -5.46,0 ; -5.46,0 -5.46,-1 -5.46,0 ; -5.46,0 -4.46,0 -5.46,0 ; -5.46,0 -6.46,0 -5.46,0 ; 0,0 0,1 0,0 ; 0,0 0,-1 0,0 ; 0,0 1,0 0,0 ; 0,0 -1,0 0,0 ; 0,22 0,23 0,22 ; 0,22 0,21 0,22 ; 0,22 1,22 0,22 ; 0,22 -1,22 0,22 ; 5.46,0 5.46,1 5.46,0 ; 5.46,0 5.46,-1 5.46,0 ; 5.46,0 6.46,0 5.46,0 ; 5.46,0 4.46,0 5.46,0
Mechanical 14:
  circle w0.1: c0,22 r3.202
  lines w0.1: -6.46,6.76 -6.46,2.44 -6.06,1.84 ; -4.46,6.76 -4.46,2.44 -4.86,1.84 ; -1.5,6.76 -1.5,3.19 -0.6,1.84 ; 1.5,6.76 1.5,3.19 0.6,1.84 ; 4.46,6.76 4.46,2.44 4.86,1.84 ; 6.46,6.76 6.46,2.44 6.06,1.84 ; 8.1,28.869 8.1,6.76 -8.1,6.76 -8.1,28.86 8.103,28.869 ; -6.06,1.84 -6.06,-0.5 -4.86,-0.5 -4.86,1.84 ; -6.06,1.84 -4.86,1.84 ; -0.6,1.84 -0.6,-0.5 0.6,-0.5 0.6,1.84 ; -0.6,1.84 0.6,1.84 ; 4.86,1.84 4.86,-0.5 6.06,-0.5 6.06,1.84 ; 4.86,1.84 6.06,1.84 ; -7.1,10.51 -7.1,25.11 -4.1,26.7 4.1,26.7 7.1,25.11 7.1,10.51 4.1,8.92 -4.1,8.92 -7.1,10.51
3D body "TO-247-HFLIP.stp": height 5.2, standoff -3.8, extent -8.1,-0.5 8.1,28.86

## TO-247-v [mm] "TO-247 3-Terminal - Vertical Mount"
height 25
pads (3):
  rect 2.5x2.5 hole 1.8: 1(-5.46,0)
  round 2.5 hole 1.8: 2(0,0) 3(5.46,0)
Top Overlay:
  lines w0.2: -7.1,0.6 -8.1,0.6 ; -7.1,2.6 -7.1,2.5 7.1,2.5 7.1,2.6 ; -3.8,0.6 -1.5,0.6 ; 1.5,0.6 4,0.6 ; 7,0.6 8.1,0.6 ; -8.1,0.6 -8.1,2.6 8.1,2.6 8.1,0.6 ; -8.1,0.6 -7.71,-2.6 7.71,-2.6 8.1,0.6
Notvisible:
  lines w0.1: -6.46,0 -5.46,0 ; -5.46,-1 -5.46,0 ; -5.46,1 -5.46,0 ; -4.46,0 -5.46,0 ; -1,0 0,0 ; 0,-1 0,0 ; 0,1 0,0 ; 1,0 0,0 ; 4.46,0 5.46,0 ; 5.46,-1 5.46,0 ; 5.46,1 5.46,0 ; 6.46,0 5.46,0
Mechanical 14:
  lines w0.1: -7.1,2.6 -7.1,2.5 7.1,2.5 7.1,2.6 ; -8.1,0.6 -8.1,2.6 8.1,2.6 8.1,0.6 ; -8.1,0.6 -7.71,-2.6 7.71,-2.6 8.1,0.6 ; -8.1,0.6 8.1,0.6
3D body "TO-247-V.stp": height 27.02, standoff -3.6, extent -8.1,-2.6 8.1,2.6

## TO-247AC-h [mm] "TO-247AC 3-Terminal - Horizontal Mount"
height 5.3
pads (4):
  rect 2.5x2.5 hole 1.8: 1(-5.46,0)
  round 2.5 hole 1.8: 2(0,0) 3(5.46,0)
  round 5.75 hole 3.5: 4(0,21.39)
Top Overlay:
  lines w0.2: -7.75,18.94 ccw(c-7.75,21.39) -7.75,23.84 ; -6.46,6.94 -6.46,2.44 -6.06,1.84 ; -6.06,1.6 -6.06,1.84 ; -4.86,1.6 -4.86,1.84 ; -4.46,6.94 -4.46,2.44 -4.86,1.84 ; -1.5,6.94 -1.5,3.19 -0.6,1.84 ; -0.6,1.6 -0.6,1.84 ; 0.6,1.6 0.6,1.84 ; 1.5,6.94 1.5,3.19 0.6,1.84 ; 4.46,6.94 4.46,2.44 4.86,1.84 ; 4.86,1.6 4.86,1.84 ; 6.06,1.6 6.06,1.84 ; 6.46,6.94 6.46,2.44 6.06,1.84 ; 7.75,18.94 cw(c7.75,21.39) 7.75,23.84 ; -6.06,1.84 -4.86,1.84 ; -0.6,1.84 0.6,1.84 ; 4.86,1.84 6.06,1.84 ; -7.75,6.94 7.75,6.94 7.75,27.14 -7.75,27.14 -7.75,6.94
Notvisible:
  lines w0.1: -5.96,0 -5.46,0 ; -5.46,-0.5 -5.46,0 ; -5.46,0.5 -5.46,0 ; -4.96,0 -5.46,0 ; -0.5,0 0,0 ; -0.5,21.39 0,21.39 ; 0,-0.5 0,0 ; 0,0.5 0,0 ; 0,20.89 0,21.39 ; 0,21.89 0,21.39 ; 0.5,0 0,0 ; 0.5,21.39 0,21.39 ; 4.96,0 5.46,0 ; 5.46,-0.5 5.46,0 ; 5.46,0.5 5.46,0 ; 5.96,0 5.46,0
Mechanical 14:
  circle w0.1: c0,21.39 r1.75
  lines w0.1: -7.75,18.94 ccw(c-7.75,21.39) -7.75,23.84 ; -6.46,6.94 -6.46,2.44 -6.06,1.84 ; -4.46,6.94 -4.46,2.44 -4.86,1.84 ; -1.5,6.94 -1.5,3.19 -0.6,1.84 ; 1.5,6.94 1.5,3.19 0.6,1.84 ; 4.46,6.94 4.46,2.44 4.86,1.84 ; 6.46,6.94 6.46,2.44 6.06,1.84 ; 7.75,18.94 cw(c7.75,21.39) 7.75,23.84 ; -6.06,1.84 -6.06,-0.5 -4.86,-0.5 -4.86,1.84 ; -6.06,1.84 -4.86,1.84 ; -0.6,1.84 -0.6,-0.5 0.6,-0.5 0.6,1.84 ; -0.6,1.84 0.6,1.84 ; 4.86,1.84 6.06,1.84 ; 4.86,1.84 4.86,-0.5 6.06,-0.5 6.06,1.84 ; -7.75,6.94 -7.75,27.14 7.75,27.14 7.75,6.94 -7.75,6.94
3D body "TO-247AC-H.stp": height 5.3, standoff -3.9, extent -7.75,-0.5 7.75,27.14